# Altium integrated library WE_WR-PHD_Pin Header_2.54mm_rev15c.IntLib: 130 symbols (part 1 of 2) (continued)
## WE-2.54 mm Pin Header & Jumper 61300911021
designator C?
WR-PHD 2.54mm Angled Pin Header; Manufacturer: Würth Elektronik eiSos GmbH; ComponentLink1 Description: Manufacturer; ComponentLink2 Description: Datasheet; NoPins: 09; Created Date: 25 March 2013; partNo: 61300911021; ComponentLink1URL: http://www.we-online.com; ComponentLink2URL: http://katalog.we-online.de/em/datasheet/6130xx11021.pdf; Created by: Karrer Zheng
footprint 61300911021 (9 pins, 1 row, right angled, gold plating)
pins: 1, 2, 3, 4, 5, 6, 7, 8, 9

## WE-2.54 mm Pin Header & Jumper 61301011021
designator C?
WR-PHD 2.54mm Angled Pin Header; Manufacturer: Würth Elektronik eiSos GmbH; ComponentLink1 Description: Manufacturer; ComponentLink2 Description: Datasheet; NoPins: 10; Created Date: 25 March 2013; partNo: 61301011021; ComponentLink1URL: http://www.we-online.com; ComponentLink2URL: http://katalog.we-online.de/em/datasheet/6130xx11021.pdf; Created by: Karrer Zheng
footprint 61301011021 (10 pins, 1 row, right angled, gold plating)
pins: 1, 2, 3, 4, 5, 6, 7, 8, 9, 10

## WE-2.54 mm Pin Header & Jumper 61301211021
designator C?
WR-PHD 2.54mm Angled Pin Header; Manufacturer: Würth Elektronik eiSos GmbH; ComponentLink1 Description: Manufacturer; ComponentLink2 Description: Datasheet; NoPins: 12; Created Date: 25 March 2013; partNo: 61301211021; ComponentLink1URL: http://www.we-online.com; ComponentLink2URL: http://katalog.we-online.de/em/datasheet/6130xx11021.pdf; Created by: Karrer Zheng
footprint 61301211021 (12 pins, 1 row, right angled, gold plating)
pins: 1, 2, 3, 4, 5, 6, 7, 8, 9, 10, 11, 12

## WE-2.54 mm Pin Header & Jumper 61301411021
designator C?
WR-PHD 2.54mm Angled Pin Header; Manufacturer: Würth Elektronik eiSos GmbH; ComponentLink1 Description: Manufacturer; ComponentLink2 Description: Datasheet; NoPins: 14; Created Date: 25 March 2013; partNo: 61301411021; ComponentLink1URL: http://www.we-online.com; ComponentLink2URL: http://katalog.we-online.de/em/datasheet/6130xx11021.pdf; Created by: Karrer Zheng
footprint 61301411021 (14 pins, 1 row, right angled, gold plating)
pins: 1, 2, 3, 4, 5, 6, 7, 8, 9, 10, 11, 12, 13, 14

## WE-2.54 mm Pin Header & Jumper 61301611021
designator C?
WR-PHD 2.54mm Angled Pin Header; Manufacturer: Würth Elektronik eiSos GmbH; ComponentLink1 Description: Manufacturer; ComponentLink2 Description: Datasheet; NoPins: 16; Created Date: 25 March 2013; partNo: 61301611021; ComponentLink1URL: http://www.we-online.com; ComponentLink2URL: http://katalog.we-online.de/em/datasheet/6130xx11021.pdf; Created by: Karrer Zheng
footprint 61301611021 (16 pins, 1 row, right angled, gold plating)
pins: 1, 2, 3, 4, 5, 6, 7, 8, 9, 10, 11, 12, 13, 14, 15, 16

## WE-2.54 mm Pin Header & Jumper 61301811021
designator C?
WR-PHD 2.54mm Angled Pin Header; Manufacturer: Würth Elektronik eiSos GmbH; ComponentLink1 Description: Manufacturer; ComponentLink2 Description: Datasheet; NoPins: 18; Created Date: 25 March 2013; partNo: 61301811021; ComponentLink1URL: http://www.we-online.com; ComponentLink2URL: http://katalog.we-online.de/em/datasheet/6130xx11021.pdf; Created by: Karrer Zheng
footprint 61301811021 (18 pins, 1 row, right angled, gold plating)
pins: 1, 2, 3, 4, 5, 6, 7, 8, 9, 10, 11, 12, 13, 14, 15, 16, 17, 18

## WE-2.54 mm Pin Header & Jumper 61302211021
designator C?
WR-PHD 2.54mm Angled Pin Header; Manufacturer: Würth Elektronik eiSos GmbH; ComponentLink1 Description: Manufacturer; ComponentLink2 Description: Datasheet; NoPins: 22; Created Date: 25 March 2013; partNo: 61302211021; ComponentLink1URL: http://www.we-online.com; ComponentLink2URL: http://katalog.we-online.de/em/datasheet/6130xx11021.pdf; Created by: Karrer Zheng
footprint 61302211021 (22 pins, 1 row, right angled, gold plating)
pins: 1, 2, 3, 4, 5, 6, 7, 8, 9, 10, 11, 12, 13, 14, 15, 16, 17, 18, 19, 20, 21, 22

## WE-2.54 mm Pin Header & Jumper 61303211021
designator C?
WR-PHD 2.54mm Angled Pin Header; Manufacturer: Würth Elektronik eiSos GmbH; ComponentLink1 Description: Manufacturer; ComponentLink2 Description: Datasheet; NoPins: 32; Created Date: 25 March 2013; partNo: 61303211021; ComponentLink1URL: http://www.we-online.com; ComponentLink2URL: http://katalog.we-online.de/em/datasheet/6130xx11021.pdf; Created by: Karrer Zheng
footprint 61303211021 (32 pins, 1 row, right angled, gold plating)
pins: 1, 2, 3, 4, 5, 6, 7, 8, 9, 10, 11, 12, 13, 14, 15, 16, 17, 18, 19, 20, 21, 22, 23, 24, 25, 26, 27, 28, 29, 30, 31, 32

## WE-2.54 mm Pin Header & Jumper 61303611021
designator C?
WR-PHD 2.54mm Angled Pin Header; Manufacturer: Würth Elektronik eiSos GmbH; ComponentLink1 Description: Manufacturer; ComponentLink2 Description: Datasheet; NoPins: 36; Created Date: 25 March 2013; partNo: 61303611021; ComponentLink1URL: http://www.we-online.com; ComponentLink2URL: http://katalog.we-online.de/em/datasheet/6130xx11021.pdf; Created by: Karrer Zheng
footprint 61303611021 (36 pins, 1 row, right angled, gold plating)
pins: 1, 2, 3, 4, 5, 6, 7, 8, 9, 10, 11, 12, 13, 14, 15, 16, 17, 18, 19, 20, 21, 22, 23, 24, 25, 26, 27, 28, 29, 30, 31, 32, 33, 34, 35, 36

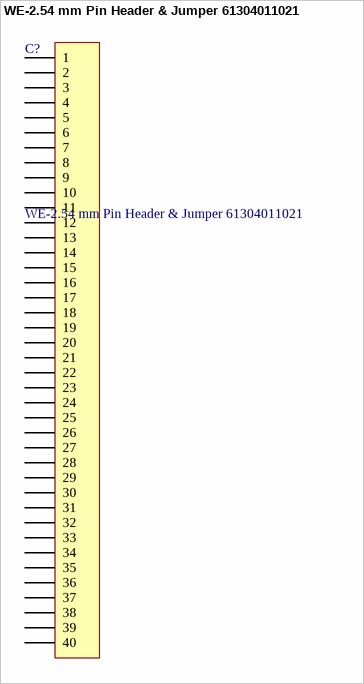
[diagram p6: symbol WE-2.54 mm Pin Header & Jumper 61304011021]

## WE-2.54 mm Pin Header & Jumper 61304011021
designator C?
WR-PHD 2.54mm Angled Pin Header; Manufacturer: Würth Elektronik eiSos GmbH; ComponentLink1 Description: Manufacturer; ComponentLink2 Description: Datasheet; NoPins: 40; Created Date: 25 March 2013; partNo: 61304011021; ComponentLink1URL: http://www.we-online.com; ComponentLink2URL: http://katalog.we-online.de/em/datasheet/6130xx11021.pdf; Created by: Karrer Zheng
footprint 61304011021 (40 pins, 1 row, right angled, gold plating)
pins: 1, 2, 3, 4, 5, 6, 7, 8, 9, 10, 11, 12, 13, 14, 15, 16, 17, 18, 19, 20, 21, 22, 23, 24, 25, 26, 27, 28, 29, 30, 31, 32, 33, 34, 35, 36, 37, 38, 39, 40


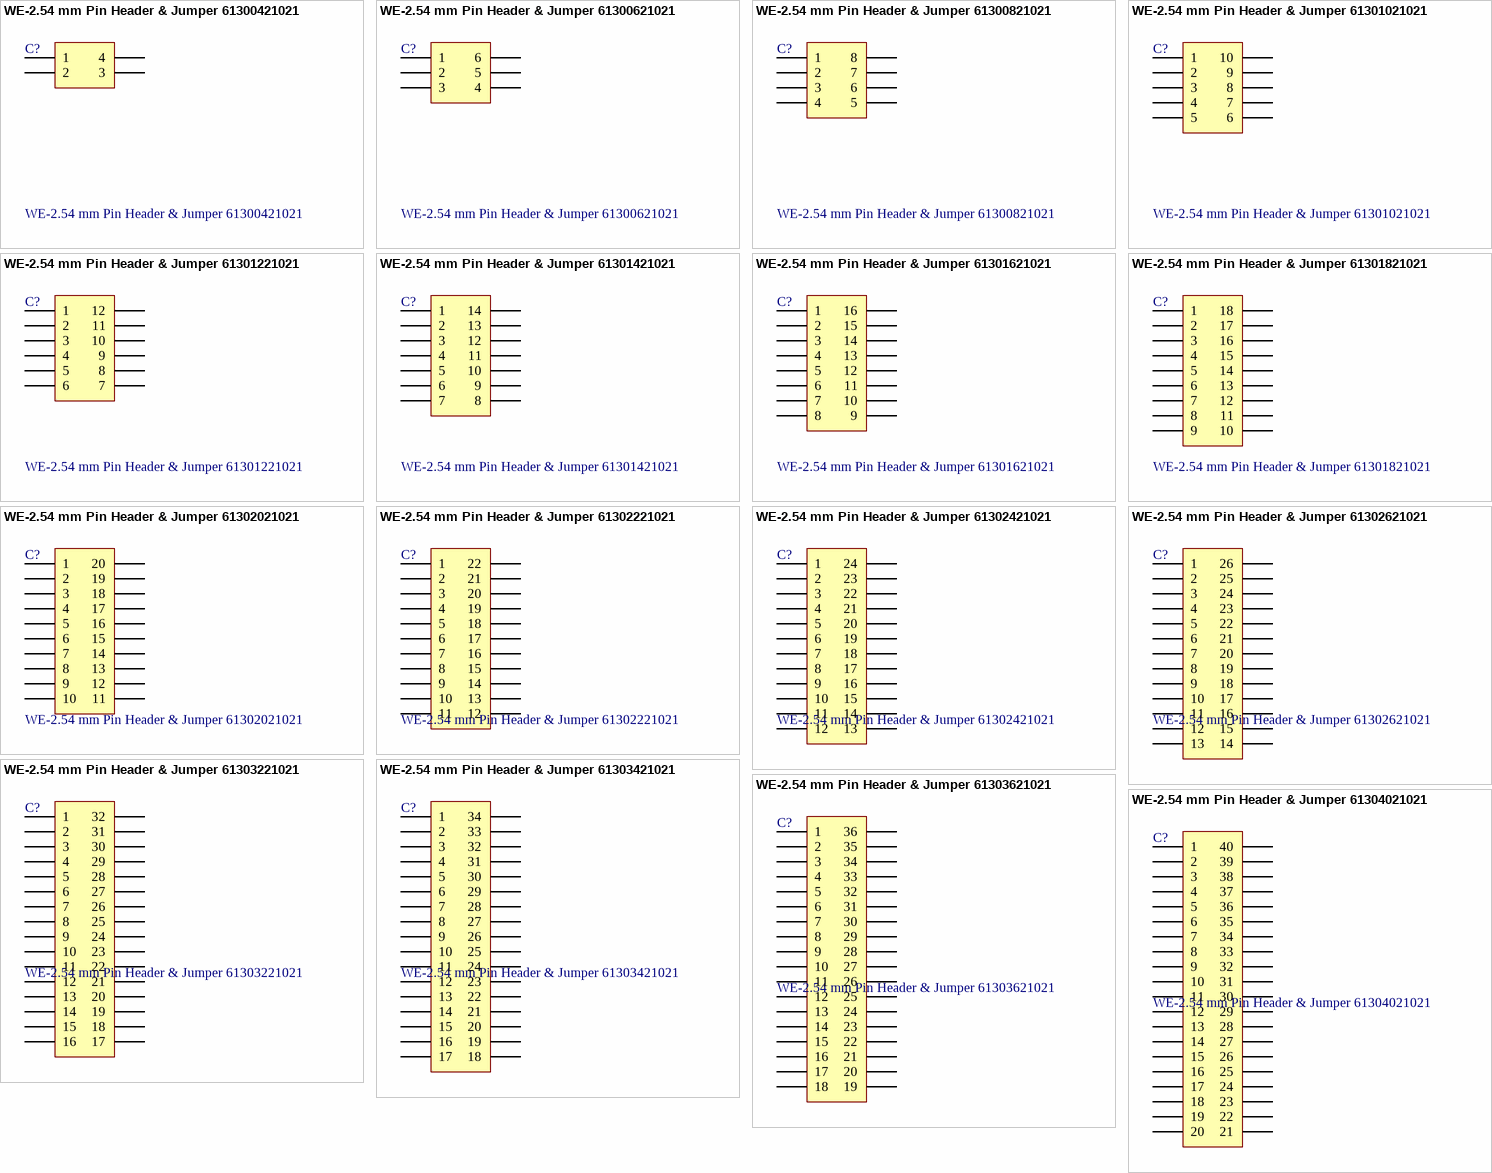
[diagram p7: symbols WE-2.54 mm Pin Header & Jumper 61300421021 to WE-2.54 mm Pin Header & Jumper 61304021021]

## WE-2.54 mm Pin Header & Jumper 61300421021
designator C?
WR-PHD 2.54 mm Angled Dual Pin Header; Manufacturer: Würth Elektronik eiSos GmbH; ComponentLink1 Description: Manufacturer; ComponentLink2 Description: Datasheet; NoPins: 04; Created Date: 25 March 2013; partNo: 61300421021; ComponentLink1URL: http://www.we-online.com; ComponentLink2URL: http://katalog.we-online.de/em/datasheet/6130xx21021.pdf; Created by: Karrer Zheng
footprint 61300421021 (4 pins, dual row, right angled, gold plating)
pins: 1, 2, 3, 4

## WE-2.54 mm Pin Header & Jumper 61300621021
designator C?
WR-PHD 2.54 mm Angled Dual Pin Header; Manufacturer: Würth Elektronik eiSos GmbH; ComponentLink1 Description: Manufacturer; ComponentLink2 Description: Datasheet; NoPins: 06; Created Date: 25 March 2013; partNo: 61300621021; ComponentLink1URL: http://www.we-online.com; ComponentLink2URL: http://katalog.we-online.de/em/datasheet/6130xx21021.pdf; Created by: Karrer Zheng
footprint 61300621021 (06 pins, dual row, right angled, gold plating)
pins: 1, 2, 3, 4, 5, 6

## WE-2.54 mm Pin Header & Jumper 61300821021
designator C?
WR-PHD 2.54 mm Angled Dual Pin Header; Manufacturer: Würth Elektronik eiSos GmbH; ComponentLink1 Description: Manufacturer; ComponentLink2 Description: Datasheet; NoPins: 08; Created Date: 25 March 2013; partNo: 61300821021; ComponentLink1URL: http://www.we-online.com; ComponentLink2URL: http://katalog.we-online.de/em/datasheet/6130xx21021.pdf; Created by: Karrer Zheng
footprint 61300821021 (08 pins, dual row, right angled, gold plating)
pins: 1, 2, 3, 4, 5, 6, 7, 8

## WE-2.54 mm Pin Header & Jumper 61301021021
designator C?
WR-PHD 2.54 mm Angled Dual Pin Header; Manufacturer: Würth Elektronik eiSos GmbH; ComponentLink1 Description: Manufacturer; ComponentLink2 Description: Datasheet; NoPins: 10; Created Date: 25 March 2013; partNo: 61301021021; ComponentLink1URL: http://www.we-online.com; ComponentLink2URL: http://katalog.we-online.de/em/datasheet/6130xx21021.pdf; Created by: Karrer Zheng
footprint 61301021021 (10 pins, dual row, right angled, gold plating)
pins: 1, 2, 3, 4, 5, 6, 7, 8, 9, 10

## WE-2.54 mm Pin Header & Jumper 61301221021
designator C?
WR-PHD 2.54 mm Angled Dual Pin Header; Manufacturer: Würth Elektronik eiSos GmbH; ComponentLink1 Description: Manufacturer; ComponentLink2 Description: Datasheet; NoPins: 12; Created Date: 25 March 2013; partNo: 61301221021; ComponentLink1URL: http://www.we-online.com; ComponentLink2URL: http://katalog.we-online.de/em/datasheet/6130xx21021.pdf; Created by: Karrer Zheng
footprint 61301221021 (12 pins, dual row, right angled, gold plating)
pins: 1, 2, 3, 4, 5, 6, 7, 8, 9, 10, 11, 12

## WE-2.54 mm Pin Header & Jumper 61301421021
designator C?
WR-PHD 2.54 mm Angled Dual Pin Header; Manufacturer: Würth Elektronik eiSos GmbH; ComponentLink1 Description: Manufacturer; ComponentLink2 Description: Datasheet; NoPins: 07; Created Date: 25 March 2013; partNo: 61301421021; ComponentLink1URL: http://www.we-online.com; ComponentLink2URL: http://katalog.we-online.de/em/datasheet/6130xx11021.pdf; Created by: Karrer Zheng
footprint 61301421021 (14 pins, dual row, right angled, gold plating)
pins: 1, 2, 3, 4, 5, 6, 7, 8, 9, 10, 11, 12, 13, 14

## WE-2.54 mm Pin Header & Jumper 61301621021
designator C?
WR-PHD 2.54 mm Angled Dual Pin Header; Manufacturer: Würth Elektronik eiSos GmbH; ComponentLink1 Description: Manufacturer; ComponentLink2 Description: Datasheet; NoPins: 16; Created Date: 25 March 2013; partNo: 61301621021; ComponentLink1URL: http://www.we-online.com; ComponentLink2URL: http://katalog.we-online.de/em/datasheet/6130xx21021.pdf; Created by: Karrer Zheng
footprint 61301621021 (16 pins, dual row, right angled, gold plating)
pins: 1, 2, 3, 4, 5, 6, 7, 8, 9, 10, 11, 12, 13, 14, 15, 16

## WE-2.54 mm Pin Header & Jumper 61301821021
designator C?
WR-PHD 2.54 mm Angled Dual Pin Header; Manufacturer: Würth Elektronik eiSos GmbH; ComponentLink1 Description: Manufacturer; ComponentLink2 Description: Datasheet; NoPins: 18; Created Date: 11/8/2014; partNo: 61301821021; ComponentLink1URL: http://www.we-online.com; ComponentLink2URL: http://katalog.we-online.de/em/datasheet/6130xx21021.pdf; Created by: Karrer Zheng
footprint 61301821021 (18 pins, dual row, right angled, gold plating)
pins: 1, 2, 3, 4, 5, 6, 7, 8, 9, 10, 11, 12, 13, 14, 15, 16, 17, 18

## WE-2.54 mm Pin Header & Jumper 61302021021
designator C?
WR-PHD 2.54 mm Angled Dual Pin Header; Manufacturer: Würth Elektronik eiSos GmbH; ComponentLink1 Description: Manufacturer; ComponentLink2 Description: Datasheet; NoPins: 20; Created Date: 25 March 2013; partNo: 61302021021; ComponentLink1URL: http://www.we-online.com; ComponentLink2URL: http://katalog.we-online.de/em/datasheet/6130xx21021.pdf; Created by: Karrer Zheng
footprint 61302021021 (20 pins, dual row, right angled, gold plating)
pins: 1, 2, 3, 4, 5, 6, 7, 8, 9, 10, 11, 12, 13, 14, 15, 16, 17, 18, 19, 20

## WE-2.54 mm Pin Header & Jumper 61302221021
designator C?
WR-PHD 2.54 mm Angled Dual Pin Header; Manufacturer: Würth Elektronik eiSos GmbH; ComponentLink1 Description: Manufacturer; ComponentLink2 Description: Datasheet; NoPins: 22; Created Date: 2014-11-06; partNo: 61302221021; ComponentLink1URL: http://www.we-online.com; ComponentLink2URL: http://katalog.we-online.de/em/datasheet/6130xx21021.pdf; Created by: Karrer Zheng
footprint 61302221021 (22 pins, dual row, right angled, gold plating)
pins: 1, 2, 3, 4, 5, 6, 7, 8, 9, 10, 11, 12, 13, 14, 15, 16, 17, 18, 19, 20, 21, 22

## WE-2.54 mm Pin Header & Jumper 61302421021
designator C?
WR-PHD 2.54 mm Angled Dual Pin Header; Manufacturer: Würth Elektronik eiSos GmbH; ComponentLink1 Description: Manufacturer; ComponentLink2 Description: Datasheet; NoPins: 24; Created Date: 25 March 2013; partNo: 61302421021; ComponentLink1URL: http://www.we-online.com; ComponentLink2URL: http://katalog.we-online.de/em/datasheet/6130xx21021.pdf; Created by: Karrer Zheng
footprint 61302421021 (24 pins, dual row, right angled, gold plating)
pins: 1, 2, 3, 4, 5, 6, 7, 8, 9, 10, 11, 12, 13, 14, 15, 16, 17, 18, 19, 20, 21, 22, 23, 24

## WE-2.54 mm Pin Header & Jumper 61302621021
designator C?
WR-PHD 2.54 mm Angled Dual Pin Header; Manufacturer: Würth Elektronik eiSos GmbH; ComponentLink1 Description: Manufacturer; ComponentLink2 Description: Datasheet; NoPins: 26; Created Date: 11/8/2014; partNo: 61302621021; ComponentLink1URL: http://www.we-online.com; ComponentLink2URL: http://katalog.we-online.de/em/datasheet/6130xx21021.pdf; Created by: Karrer Zheng
footprint 61302621021 (26 pins, dual row, right angled, gold plating)
pins: 1, 2, 3, 4, 5, 6, 7, 8, 9, 10, 11, 12, 13, 14, 15, 16, 17, 18, 19, 20, 21, 22, 23, 24, 25, 26

## WE-2.54 mm Pin Header & Jumper 61303221021
designator C?
WR-PHD 2.54 mm Angled Dual Pin Header; Manufacturer: Würth Elektronik eiSos GmbH; ComponentLink1 Description: Manufacturer; ComponentLink2 Description: Datasheet; NoPins: 32; Created Date: 25 March 2013; partNo: 61303221021; ComponentLink1URL: http://www.we-online.com; ComponentLink2URL: http://katalog.we-online.de/em/datasheet/6130xx21021.pdf; Created by: Karrer Zheng
footprint 61303221021 (32 pins, dual row, right angled, gold plating)
pins: 1, 2, 3, 4, 5, 6, 7, 8, 9, 10, 11, 12, 13, 14, 15, 16, 17, 18, 19, 20, 21, 22, 23, 24, 25, 26, 27, 28, 29, 30, 31, 32

## WE-2.54 mm Pin Header & Jumper 61303421021
designator C?
WR-PHD 2.54 mm Angled Dual Pin Header; Manufacturer: Würth Elektronik eiSos GmbH; ComponentLink1 Description: Manufacturer; ComponentLink2 Description: Datasheet; NoPins: 34; Created Date: 25 March 2013; partNo: 61303421021; ComponentLink1URL: http://www.we-online.com; ComponentLink2URL: http://katalog.we-online.de/em/datasheet/6130xx21021.pdf; Created by: Karrer Zheng
footprint 61303421021 (34 pins, dual row, right angled, gold plating)
pins: 1, 2, 3, 4, 5, 6, 7, 8, 9, 10, 11, 12, 13, 14, 15, 16, 17, 18, 19, 20, 21, 22, 23, 24, 25, 26, 27, 28, 29, 30, 31, 32, 33, 34

## WE-2.54 mm Pin Header & Jumper 61303621021
designator C?
WR-PHD 2.54 mm Angled Dual Pin Header; Manufacturer: Würth Elektronik eiSos GmbH; ComponentLink1 Description: Manufacturer; ComponentLink2 Description: Datasheet; NoPins: 36; Created Date: 25 March 2013; partNo: 61303621021; ComponentLink1URL: http://www.we-online.com; ComponentLink2URL: http://katalog.we-online.de/em/datasheet/6130xx21021.pdf; Created by: Karrer Zheng
footprint 61303621021 (36 pins, dual row, right angled, gold plating)
pins: 1, 2, 3, 4, 5, 6, 7, 8, 9, 10, 11, 12, 13, 14, 15, 16, 17, 18, 19, 20, 21, 22, 23, 24, 25, 26, 27, 28, 29, 30, 31, 32, 33, 34, 35, 36

## WE-2.54 mm Pin Header & Jumper 61304021021
designator C?
WR-PHD 2.54 mm Angled Dual Pin Header; Manufacturer: Würth Elektronik eiSos GmbH; ComponentLink1 Description: Manufacturer; ComponentLink2 Description: Datasheet; NoPins: 40; Created Date: 25 March 2013; partNo: 61304021021; ComponentLink1URL: http://www.we-online.com; ComponentLink2URL: http://katalog.we-online.de/em/datasheet/6130xx21021.pdf; Created by: Karrer Zheng
footprint 61304021021 (40 pins, dual row, right angled, gold plating)
pins: 1, 2, 3, 4, 5, 6, 7, 8, 9, 10, 11, 12, 13, 14, 15, 16, 17, 18, 19, 20, 21, 22, 23, 24, 25, 26, 27, 28, 29, 30, 31, 32, 33, 34, 35, 36, 37, 38, 39, 40

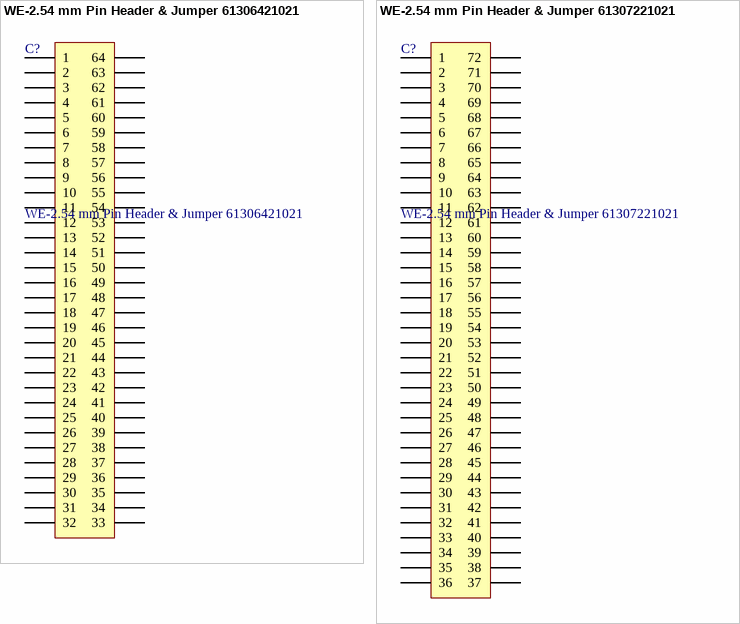
[diagram p8: symbols WE-2.54 mm Pin Header & Jumper 61306421021 to WE-2.54 mm Pin Header & Jumper 61307221021]

## WE-2.54 mm Pin Header & Jumper 61306421021
designator C?
WR-PHD 2.54 mm Angled Dual Pin Header; Manufacturer: Würth Elektronik eiSos GmbH; ComponentLink1 Description: Manufacturer; ComponentLink2 Description: Datasheet; NoPins: 64; Created Date: 25 March 2013; partNo: 61306421021; ComponentLink1URL: http://www.we-online.com; ComponentLink2URL: http://katalog.we-online.de/em/datasheet/6130xx21021.pdf; Created by: Karrer Zheng
footprint 61306421021 (64 pins, dual row, right angled, gold plating)
pins: 1, 2, 3, 4, 5, 6, 7, 8, 9, 10, 11, 12, 13, 14, 15, 16, 17, 18, 19, 20, 21, 22, 23, 24, 25, 26, 27, 28, 29, 30, 31, 32, 33, 34, 35, 36, 37, 38, 39, 40, 41, 42, 43, 44, 45, 46, 47, 48, 49, 50, 51, 52, 53, 54, 55, 56, 57, 58, 59, 60, 61, 62, 63, 64

## WE-2.54 mm Pin Header & Jumper 61307221021
designator C?
WR-PHD 2.54 mm Angled Dual Pin Header; Manufacturer: Würth Elektronik eiSos GmbH; ComponentLink1 Description: Manufacturer; ComponentLink2 Description: Datasheet; NoPins: 72; Created Date: 25 March 2013; partNo: 61307221021; ComponentLink1URL: http://www.we-online.com; ComponentLink2URL: http://katalog.we-online.de/em/datasheet/6130xx21021.pdf; Created by: Karrer Zheng
footprint 61307221021 (72 pins, dual row, right angled, gold plating)
pins: 1, 2, 3, 4, 5, 6, 7, 8, 9, 10, 11, 12, 13, 14, 15, 16, 17, 18, 19, 20, 21, 22, 23, 24, 25, 26, 27, 28, 29, 30, 31, 32, 33, 34, 35, 36, 37, 38, 39, 40, 41, 42, 43, 44, 45, 46, 47, 48, 49, 50, 51, 52, 53, 54, 55, 56, 57, 58, 59, 60, 61, 62, 63, 64, 65, 66, 67, 68, 69, 70, 71, 72


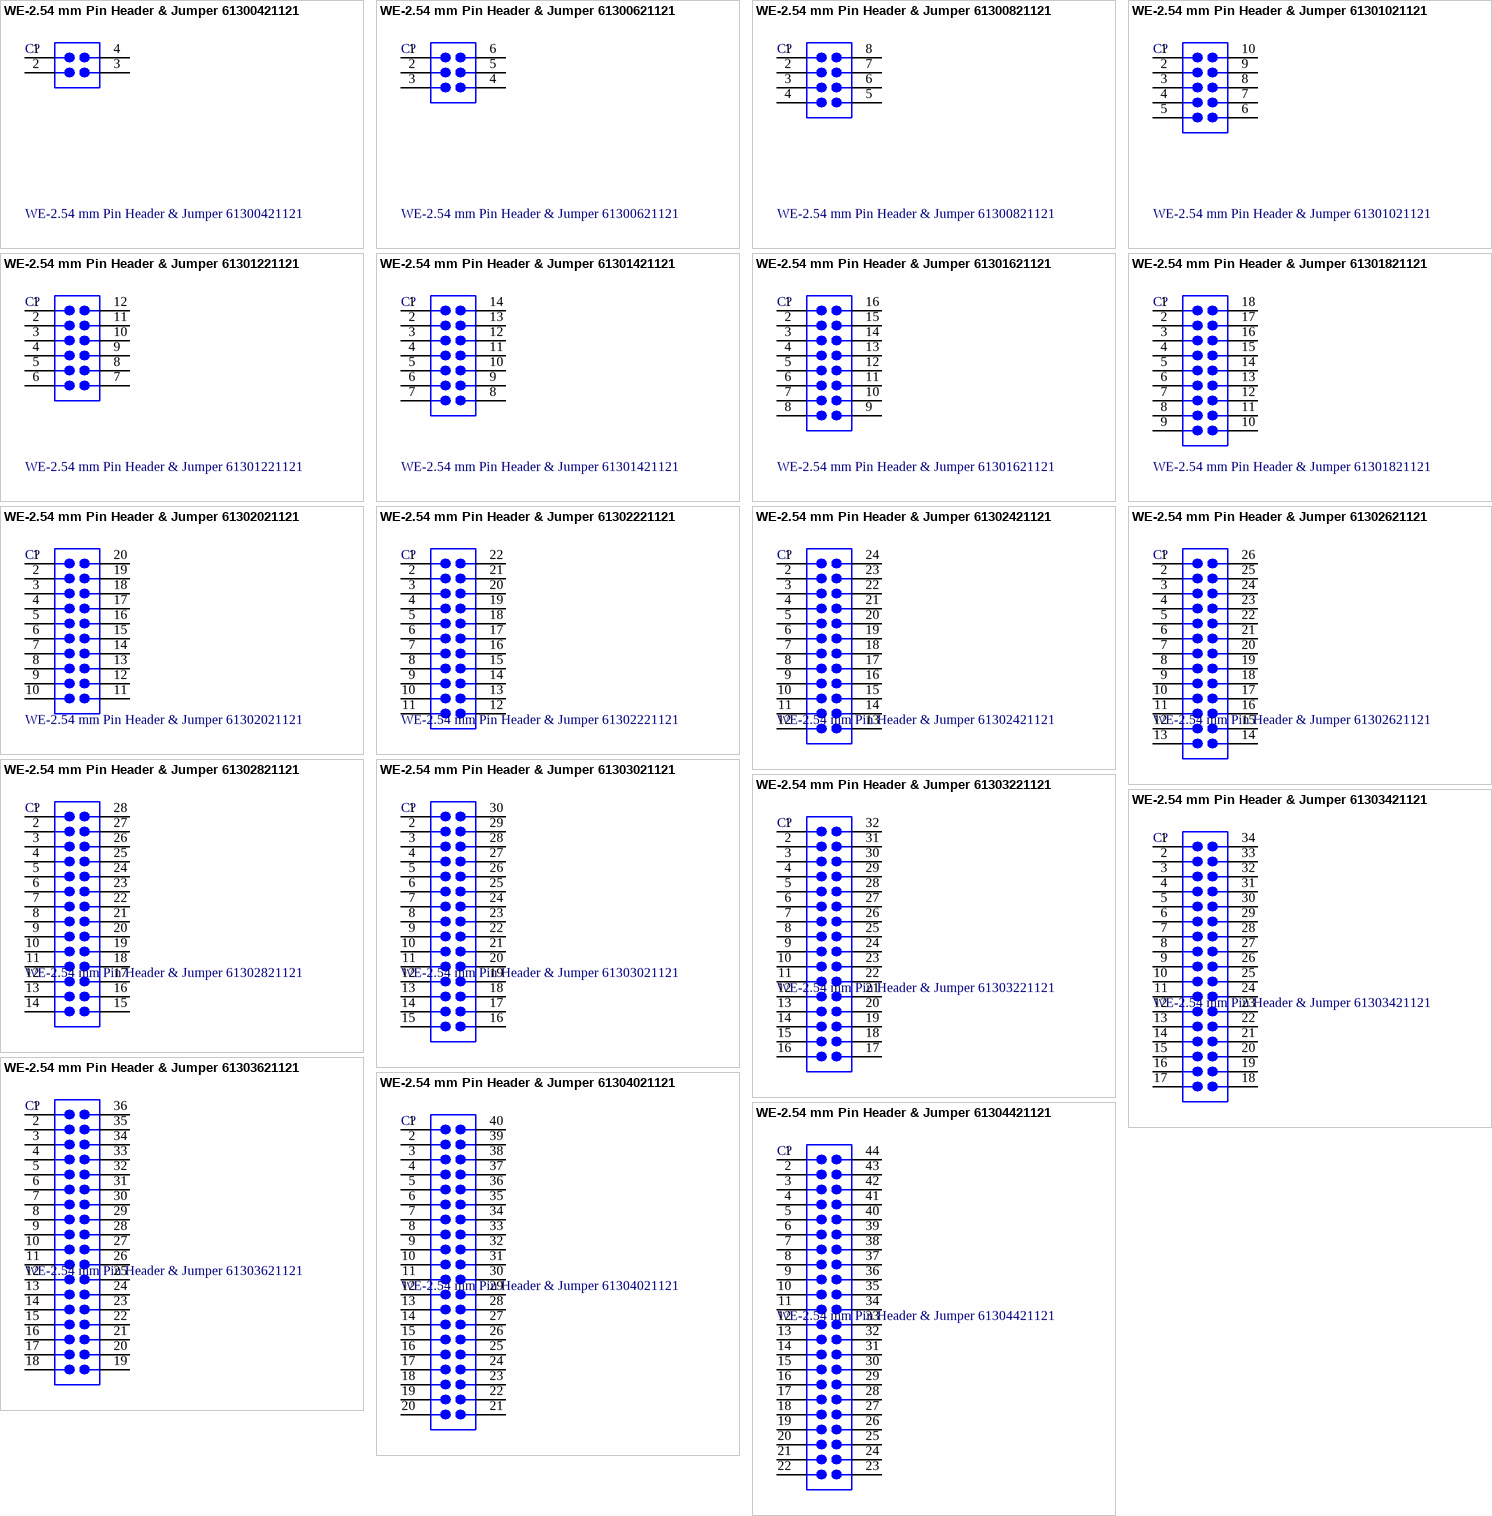
[diagram p9: symbols WE-2.54 mm Pin Header & Jumper 61300421121 to WE-2.54 mm Pin Header & Jumper 61304421121]

## WE-2.54 mm Pin Header & Jumper 61300421121
designator C?
WR-PHD 2.54 mm Dual Pin Header; Manufacturer: Würth Elektronik eiSos GmbH; ComponentLink1 Description: Manufacturer; ComponentLink2 Description: Datasheet; NoPins: 04; Created Date: 25 March 2013; partNo: 61300421121; ComponentLink1URL: http://www.we-online.com; ComponentLink2URL: http://katalog.we-online.de/em/datasheet/6130xx21121.pdf; Created by: Karrer Zheng
footprint 61300421121 (4 pins, dual pin, straight, gold plating)
pins: 1, 2, 3, 4

## WE-2.54 mm Pin Header & Jumper 61300621121
designator C?
WR-PHD 2.54 mm Dual Pin Header; Manufacturer: Würth Elektronik eiSos GmbH; ComponentLink1 Description: Manufacturer; ComponentLink2 Description: Datasheet; NoPins: 06; Created Date: 25 March 2013; partNo: 61300621121; ComponentLink1URL: http://www.we-online.com; ComponentLink2URL: http://katalog.we-online.de/em/datasheet/6130xx21121.pdf; Created by: Karrer Zheng
footprint 61300621121 (6 pins, dual pin, straight, gold plating)
pins: 1, 2, 3, 4, 5, 6
